# Altium integrated library Weidmueller_OMNIMATE_Signal.IntLib: 2550 symbols (part 16 of 45) (continued)
## 1630270000_Single (continued)
OMNIMATE Signal - series BL/SL 5.00; PartNumber: 1630270000; Manufacturer: Weidmueller; Short_text_for_material: SL 5.00/04/135 3.2SN OR BX; Side_termination_characteristic: open side; Mounting_onto_the_PCB: Solder connection; Pitch_mm: 5 mm; Pitch_inch: 0.197 inch; No_of_poles: 4; Outgoing_elbow: 135°; Solder_pin_length_mm: 3.2 mm; Contact_material: CuSn; Contact_surface: tinned; Insulating_material: PBT; UL_94_flammability_rating: V-0; Rated_voltage_for_surge_voltage_class_pollution_degree_II_2: 400 V; Rated_current_min_no_of_poles_TU_20_deg_C: 32 A; Rated_voltage_use_group_B_UL_1059: 300 V; Rated_current_use_group_B_UL_1059: 15 A; PackageReference: SL_5_00_135_04; Colour: Orange; Packaging: Box; Qty: 100 PCS; Revision: V1; ComponentLink1Description: Manufacturer URL; ComponentLink1URL: http://www.weidmueller.com/; ComponentLink2Description: URL Link1; ComponentLink2URL: http://catalog.weidmueller.com/catalog/Start.do?localeId=en&ObjectID=1630270000
footprint SL_5_00_135_04 (OMNIMATE Signal - Serie BL/SL 5.00  SL 5.00/04/135 3.2)
part A pins: A1
part B pins: A2
part C pins: A3
part D pins: A4

## 1630310000
designator J?
OMNIMATE Signal - series BL/SL 5.00; PartNumber: 1630310000; Manufacturer: Weidmueller; Short_text_for_material: SL 5.00/08/135 3.2SN OR BX; Side_termination_characteristic: open side; Mounting_onto_the_PCB: Solder connection; Pitch_mm: 5 mm; Pitch_inch: 0.197 inch; No_of_poles: 8; Outgoing_elbow: 135°; Solder_pin_length_mm: 3.2 mm; Contact_material: CuSn; Contact_surface: tinned; Insulating_material: PBT; UL_94_flammability_rating: V-0; Rated_voltage_for_surge_voltage_class_pollution_degree_II_2: 400 V; Rated_current_min_no_of_poles_TU_20_deg_C: 32 A; Rated_voltage_use_group_B_UL_1059: 300 V; Rated_current_use_group_B_UL_1059: 15 A; PackageReference: SL_5_00_135_08; Colour: Orange; Packaging: Box; Qty: 50 PCS; Revision: V1; ComponentLink1Description: Manufacturer URL; ComponentLink1URL: http://www.weidmueller.com/; ComponentLink2Description: URL Link1; ComponentLink2URL: http://catalog.weidmueller.com/catalog/Start.do?localeId=en&ObjectID=1630310000
footprint SL_5_00_135_08 (OMNIMATE Signal - Serie BL/SL 5.00  SL 5.00/08/135 3.2)
pins: A1, A2, A3, A4, A5, A6, A7, A8

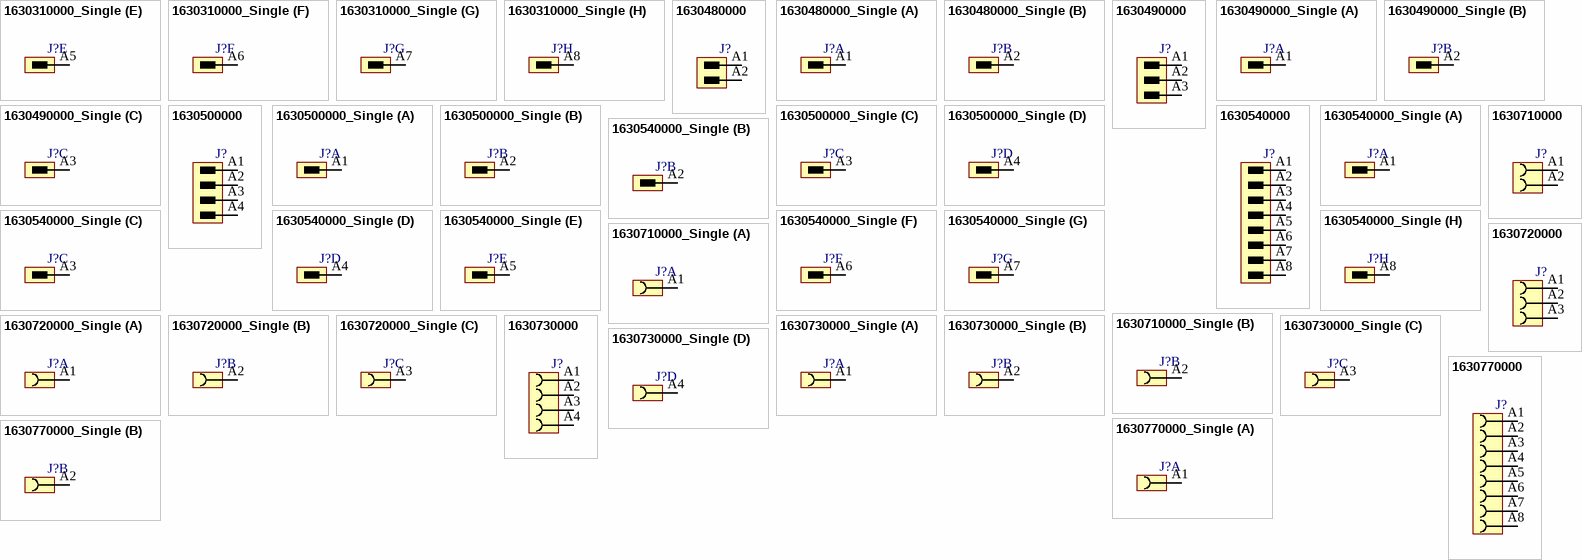
[diagram p89: symbols 1630310000_Single to 1630770000_Single]

## 1630310000_Single
designator J?
OMNIMATE Signal - series BL/SL 5.00; PartNumber: 1630310000; Manufacturer: Weidmueller; Short_text_for_material: SL 5.00/08/135 3.2SN OR BX; Side_termination_characteristic: open side; Mounting_onto_the_PCB: Solder connection; Pitch_mm: 5 mm; Pitch_inch: 0.197 inch; No_of_poles: 8; Outgoing_elbow: 135°; Solder_pin_length_mm: 3.2 mm; Contact_material: CuSn; Contact_surface: tinned; Insulating_material: PBT; UL_94_flammability_rating: V-0; Rated_voltage_for_surge_voltage_class_pollution_degree_II_2: 400 V; Rated_current_min_no_of_poles_TU_20_deg_C: 32 A; Rated_voltage_use_group_B_UL_1059: 300 V; Rated_current_use_group_B_UL_1059: 15 A; PackageReference: SL_5_00_135_08; Colour: Orange; Packaging: Box; Qty: 50 PCS; Revision: V1; ComponentLink1Description: Manufacturer URL; ComponentLink1URL: http://www.weidmueller.com/; ComponentLink2Description: URL Link1; ComponentLink2URL: http://catalog.weidmueller.com/catalog/Start.do?localeId=en&ObjectID=1630310000
footprint SL_5_00_135_08 (OMNIMATE Signal - Serie BL/SL 5.00  SL 5.00/08/135 3.2)
part A pins: A1
part B pins: A2
part C pins: A3
part D pins: A4
part E pins: A5
part F pins: A6
part G pins: A7
part H pins: A8

## 1630480000
designator J?
OMNIMATE Signal - series BL/SL 5.00; PartNumber: 1630480000; Manufacturer: Weidmueller; Short_text_for_material: SL 5.00/02/135B 3.2SN OR BX; Side_termination_characteristic: Dovetails for fixing blocks; Mounting_onto_the_PCB: Solder connection; Pitch_mm: 5 mm; Pitch_inch: 0.197 inch; No_of_poles: 2; Outgoing_elbow: 135°; Solder_pin_length_mm: 3.2 mm; Contact_material: CuSn; Contact_surface: tinned; Insulating_material: PBT; UL_94_flammability_rating: V-0; Rated_voltage_for_surge_voltage_class_pollution_degree_II_2: 400 V; Rated_current_min_no_of_poles_TU_20_deg_C: 32 A; Rated_voltage_use_group_B_UL_1059: 300 V; Rated_current_use_group_B_UL_1059: 15 A; PackageReference: SL_5_00_135B_02; Colour: Orange; Packaging: Box; Qty: 100 PCS; Revision: V1; ComponentLink1Description: Manufacturer URL; ComponentLink1URL: http://www.weidmueller.com/; ComponentLink2Description: URL Link1; ComponentLink2URL: http://catalog.weidmueller.com/catalog/Start.do?localeId=en&ObjectID=1630480000
footprint SL_5_00_135B_02 (OMNIMATE Signal - Serie BL/SL 5.00  SL 5.00/02/135B 3.2)
pins: A1, A2

## 1630480000_Single
designator J?
OMNIMATE Signal - series BL/SL 5.00; PartNumber: 1630480000; Manufacturer: Weidmueller; Short_text_for_material: SL 5.00/02/135B 3.2SN OR BX; Side_termination_characteristic: Dovetails for fixing blocks; Mounting_onto_the_PCB: Solder connection; Pitch_mm: 5 mm; Pitch_inch: 0.197 inch; No_of_poles: 2; Outgoing_elbow: 135°; Solder_pin_length_mm: 3.2 mm; Contact_material: CuSn; Contact_surface: tinned; Insulating_material: PBT; UL_94_flammability_rating: V-0; Rated_voltage_for_surge_voltage_class_pollution_degree_II_2: 400 V; Rated_current_min_no_of_poles_TU_20_deg_C: 32 A; Rated_voltage_use_group_B_UL_1059: 300 V; Rated_current_use_group_B_UL_1059: 15 A; PackageReference: SL_5_00_135B_02; Colour: Orange; Packaging: Box; Qty: 100 PCS; Revision: V1; ComponentLink1Description: Manufacturer URL; ComponentLink1URL: http://www.weidmueller.com/; ComponentLink2Description: URL Link1; ComponentLink2URL: http://catalog.weidmueller.com/catalog/Start.do?localeId=en&ObjectID=1630480000
footprint SL_5_00_135B_02 (OMNIMATE Signal - Serie BL/SL 5.00  SL 5.00/02/135B 3.2)
part A pins: A1
part B pins: A2

## 1630490000
designator J?
OMNIMATE Signal - series BL/SL 5.00; PartNumber: 1630490000; Manufacturer: Weidmueller; Short_text_for_material: SL 5.00/03/135B 3.2SN OR BX; Side_termination_characteristic: Dovetails for fixing blocks; Mounting_onto_the_PCB: Solder connection; Pitch_mm: 5 mm; Pitch_inch: 0.197 inch; No_of_poles: 3; Outgoing_elbow: 135°; Solder_pin_length_mm: 3.2 mm; Contact_material: CuSn; Contact_surface: tinned; Insulating_material: PBT; UL_94_flammability_rating: V-0; Rated_voltage_for_surge_voltage_class_pollution_degree_II_2: 400 V; Rated_current_min_no_of_poles_TU_20_deg_C: 32 A; Rated_voltage_use_group_B_UL_1059: 300 V; Rated_current_use_group_B_UL_1059: 15 A; PackageReference: SL_5_00_135B_03; Colour: Orange; Packaging: Box; Qty: 100 PCS; Revision: V1; ComponentLink1Description: Manufacturer URL; ComponentLink1URL: http://www.weidmueller.com/; ComponentLink2Description: URL Link1; ComponentLink2URL: http://catalog.weidmueller.com/catalog/Start.do?localeId=en&ObjectID=1630490000
footprint SL_5_00_135B_03 (OMNIMATE Signal - Serie BL/SL 5.00  SL 5.00/03/135B 3.2)
pins: A1, A2, A3

## 1630490000_Single
designator J?
OMNIMATE Signal - series BL/SL 5.00; PartNumber: 1630490000; Manufacturer: Weidmueller; Short_text_for_material: SL 5.00/03/135B 3.2SN OR BX; Side_termination_characteristic: Dovetails for fixing blocks; Mounting_onto_the_PCB: Solder connection; Pitch_mm: 5 mm; Pitch_inch: 0.197 inch; No_of_poles: 3; Outgoing_elbow: 135°; Solder_pin_length_mm: 3.2 mm; Contact_material: CuSn; Contact_surface: tinned; Insulating_material: PBT; UL_94_flammability_rating: V-0; Rated_voltage_for_surge_voltage_class_pollution_degree_II_2: 400 V; Rated_current_min_no_of_poles_TU_20_deg_C: 32 A; Rated_voltage_use_group_B_UL_1059: 300 V; Rated_current_use_group_B_UL_1059: 15 A; PackageReference: SL_5_00_135B_03; Colour: Orange; Packaging: Box; Qty: 100 PCS; Revision: V1; ComponentLink1Description: Manufacturer URL; ComponentLink1URL: http://www.weidmueller.com/; ComponentLink2Description: URL Link1; ComponentLink2URL: http://catalog.weidmueller.com/catalog/Start.do?localeId=en&ObjectID=1630490000
footprint SL_5_00_135B_03 (OMNIMATE Signal - Serie BL/SL 5.00  SL 5.00/03/135B 3.2)
part A pins: A1
part B pins: A2
part C pins: A3

## 1630500000
designator J?
OMNIMATE Signal - series BL/SL 5.00; PartNumber: 1630500000; Manufacturer: Weidmueller; Short_text_for_material: SL 5.00/04/135B 3.2SN OR BX; Side_termination_characteristic: Dovetails for fixing blocks; Mounting_onto_the_PCB: Solder connection; Pitch_mm: 5 mm; Pitch_inch: 0.197 inch; No_of_poles: 4; Outgoing_elbow: 135°; Solder_pin_length_mm: 3.2 mm; Contact_material: CuSn; Contact_surface: tinned; Insulating_material: PBT; UL_94_flammability_rating: V-0; Rated_voltage_for_surge_voltage_class_pollution_degree_II_2: 400 V; Rated_current_min_no_of_poles_TU_20_deg_C: 32 A; Rated_voltage_use_group_B_UL_1059: 300 V; Rated_current_use_group_B_UL_1059: 15 A; PackageReference: SL_5_00_135B_04; Colour: Orange; Packaging: Box; Qty: 100 PCS; Revision: V1; ComponentLink1Description: Manufacturer URL; ComponentLink1URL: http://www.weidmueller.com/; ComponentLink2Description: URL Link1; ComponentLink2URL: http://catalog.weidmueller.com/catalog/Start.do?localeId=en&ObjectID=1630500000
footprint SL_5_00_135B_04 (OMNIMATE Signal - Serie BL/SL 5.00  SL 5.00/04/135B 3.2)
pins: A1, A2, A3, A4

## 1630500000_Single
designator J?
OMNIMATE Signal - series BL/SL 5.00; PartNumber: 1630500000; Manufacturer: Weidmueller; Short_text_for_material: SL 5.00/04/135B 3.2SN OR BX; Side_termination_characteristic: Dovetails for fixing blocks; Mounting_onto_the_PCB: Solder connection; Pitch_mm: 5 mm; Pitch_inch: 0.197 inch; No_of_poles: 4; Outgoing_elbow: 135°; Solder_pin_length_mm: 3.2 mm; Contact_material: CuSn; Contact_surface: tinned; Insulating_material: PBT; UL_94_flammability_rating: V-0; Rated_voltage_for_surge_voltage_class_pollution_degree_II_2: 400 V; Rated_current_min_no_of_poles_TU_20_deg_C: 32 A; Rated_voltage_use_group_B_UL_1059: 300 V; Rated_current_use_group_B_UL_1059: 15 A; PackageReference: SL_5_00_135B_04; Colour: Orange; Packaging: Box; Qty: 100 PCS; Revision: V1; ComponentLink1Description: Manufacturer URL; ComponentLink1URL: http://www.weidmueller.com/; ComponentLink2Description: URL Link1; ComponentLink2URL: http://catalog.weidmueller.com/catalog/Start.do?localeId=en&ObjectID=1630500000
footprint SL_5_00_135B_04 (OMNIMATE Signal - Serie BL/SL 5.00  SL 5.00/04/135B 3.2)
part A pins: A1
part B pins: A2
part C pins: A3
part D pins: A4

## 1630540000
designator J?
OMNIMATE Signal - series BL/SL 5.00; PartNumber: 1630540000; Manufacturer: Weidmueller; Short_text_for_material: SL 5.00/08/135B 3.2SN OR BX; Side_termination_characteristic: Dovetails for fixing blocks; Mounting_onto_the_PCB: Solder connection; Pitch_mm: 5 mm; Pitch_inch: 0.197 inch; No_of_poles: 8; Outgoing_elbow: 135°; Solder_pin_length_mm: 3.2 mm; Contact_material: CuSn; Contact_surface: tinned; Insulating_material: PBT; UL_94_flammability_rating: V-0; Rated_voltage_for_surge_voltage_class_pollution_degree_II_2: 400 V; Rated_current_min_no_of_poles_TU_20_deg_C: 32 A; Rated_voltage_use_group_B_UL_1059: 300 V; Rated_current_use_group_B_UL_1059: 15 A; PackageReference: SL_5_00_135B_08; Colour: Orange; Packaging: Box; Qty: 50 PCS; Revision: V1; ComponentLink1Description: Manufacturer URL; ComponentLink1URL: http://www.weidmueller.com/; ComponentLink2Description: URL Link1; ComponentLink2URL: http://catalog.weidmueller.com/catalog/Start.do?localeId=en&ObjectID=1630540000
footprint SL_5_00_135B_08 (OMNIMATE Signal - Serie BL/SL 5.00  SL 5.00/08/135B 3.2)
pins: A1, A2, A3, A4, A5, A6, A7, A8

## 1630540000_Single
designator J?
OMNIMATE Signal - series BL/SL 5.00; PartNumber: 1630540000; Manufacturer: Weidmueller; Short_text_for_material: SL 5.00/08/135B 3.2SN OR BX; Side_termination_characteristic: Dovetails for fixing blocks; Mounting_onto_the_PCB: Solder connection; Pitch_mm: 5 mm; Pitch_inch: 0.197 inch; No_of_poles: 8; Outgoing_elbow: 135°; Solder_pin_length_mm: 3.2 mm; Contact_material: CuSn; Contact_surface: tinned; Insulating_material: PBT; UL_94_flammability_rating: V-0; Rated_voltage_for_surge_voltage_class_pollution_degree_II_2: 400 V; Rated_current_min_no_of_poles_TU_20_deg_C: 32 A; Rated_voltage_use_group_B_UL_1059: 300 V; Rated_current_use_group_B_UL_1059: 15 A; PackageReference: SL_5_00_135B_08; Colour: Orange; Packaging: Box; Qty: 50 PCS; Revision: V1; ComponentLink1Description: Manufacturer URL; ComponentLink1URL: http://www.weidmueller.com/; ComponentLink2Description: URL Link1; ComponentLink2URL: http://catalog.weidmueller.com/catalog/Start.do?localeId=en&ObjectID=1630540000
footprint SL_5_00_135B_08 (OMNIMATE Signal - Serie BL/SL 5.00  SL 5.00/08/135B 3.2)
part A pins: A1
part B pins: A2
part C pins: A3
part D pins: A4
part E pins: A5
part F pins: A6
part G pins: A7
part H pins: A8

## 1630710000
designator J?
OMNIMATE Signal - series BL/SL 5.08; PartNumber: 1630710000; Manufacturer: Weidmueller; Short_text_for_material: BLL 5.08/02/180 3.2 SN OR BX; Side_termination_characteristic: closed side; Mounting_onto_the_PCB: Solder connection; Pitch_mm: 5.08 mm; Pitch_inch: 0.2 inch; No_of_poles: 2; Outgoing_elbow: 180°; Solder_pin_length_mm: 3.2 mm; Contact_material: Cu-Leg; Contact_surface: tinned; Insulating_material: PBT GF; UL_94_flammability_rating: V-0; Rated_voltage_for_surge_voltage_class_pollution_degree_II_2: 400 V; Rated_current_min_no_of_poles_TU_20_deg_C: 32 A; Rated_voltage_use_group_B_UL_1059: 300 V; Rated_current_use_group_B_UL_1059: 15 A; PackageReference: BLL_5_08_180_02; Colour: Orange; Packaging: Box; Qty: 180 PCS; Revision: V1; ComponentLink1Description: Manufacturer URL; ComponentLink1URL: http://www.weidmueller.com/; ComponentLink2Description: URL Link1; ComponentLink2URL: http://catalog.weidmueller.com/catalog/Start.do?localeId=en&ObjectID=1630710000
footprint BLL_5_08_180_02 (OMNIMATE Signal - Serie BL/SL 5.08  BLL 5.08/02/180 3.2)
pins: A1, A2

## 1630710000_Single
designator J?
OMNIMATE Signal - series BL/SL 5.08; PartNumber: 1630710000; Manufacturer: Weidmueller; Short_text_for_material: BLL 5.08/02/180 3.2 SN OR BX; Side_termination_characteristic: closed side; Mounting_onto_the_PCB: Solder connection; Pitch_mm: 5.08 mm; Pitch_inch: 0.2 inch; No_of_poles: 2; Outgoing_elbow: 180°; Solder_pin_length_mm: 3.2 mm; Contact_material: Cu-Leg; Contact_surface: tinned; Insulating_material: PBT GF; UL_94_flammability_rating: V-0; Rated_voltage_for_surge_voltage_class_pollution_degree_II_2: 400 V; Rated_current_min_no_of_poles_TU_20_deg_C: 32 A; Rated_voltage_use_group_B_UL_1059: 300 V; Rated_current_use_group_B_UL_1059: 15 A; PackageReference: BLL_5_08_180_02; Colour: Orange; Packaging: Box; Qty: 180 PCS; Revision: V1; ComponentLink1Description: Manufacturer URL; ComponentLink1URL: http://www.weidmueller.com/; ComponentLink2Description: URL Link1; ComponentLink2URL: http://catalog.weidmueller.com/catalog/Start.do?localeId=en&ObjectID=1630710000
footprint BLL_5_08_180_02 (OMNIMATE Signal - Serie BL/SL 5.08  BLL 5.08/02/180 3.2)
part A pins: A1
part B pins: A2

## 1630720000
designator J?
OMNIMATE Signal - series BL/SL 5.08; PartNumber: 1630720000; Manufacturer: Weidmueller; Short_text_for_material: BLL 5.08/03/180 3.2 SN OR BX; Side_termination_characteristic: closed side; Mounting_onto_the_PCB: Solder connection; Pitch_mm: 5.08 mm; Pitch_inch: 0.2 inch; No_of_poles: 3; Outgoing_elbow: 180°; Solder_pin_length_mm: 3.2 mm; Contact_material: Cu-Leg; Contact_surface: tinned; Insulating_material: PBT GF; UL_94_flammability_rating: V-0; Rated_voltage_for_surge_voltage_class_pollution_degree_II_2: 400 V; Rated_current_min_no_of_poles_TU_20_deg_C: 32 A; Rated_voltage_use_group_B_UL_1059: 300 V; Rated_current_use_group_B_UL_1059: 15 A; PackageReference: BLL_5_08_180_03; Colour: Orange; Packaging: Box; Qty: 120 PCS; Revision: V1; ComponentLink1Description: Manufacturer URL; ComponentLink1URL: http://www.weidmueller.com/; ComponentLink2Description: URL Link1; ComponentLink2URL: http://catalog.weidmueller.com/catalog/Start.do?localeId=en&ObjectID=1630720000
footprint BLL_5_08_180_03 (OMNIMATE Signal - Serie BL/SL 5.08  BLL 5.08/03/180 3.2)
pins: A1, A2, A3

## 1630720000_Single
designator J?
OMNIMATE Signal - series BL/SL 5.08; PartNumber: 1630720000; Manufacturer: Weidmueller; Short_text_for_material: BLL 5.08/03/180 3.2 SN OR BX; Side_termination_characteristic: closed side; Mounting_onto_the_PCB: Solder connection; Pitch_mm: 5.08 mm; Pitch_inch: 0.2 inch; No_of_poles: 3; Outgoing_elbow: 180°; Solder_pin_length_mm: 3.2 mm; Contact_material: Cu-Leg; Contact_surface: tinned; Insulating_material: PBT GF; UL_94_flammability_rating: V-0; Rated_voltage_for_surge_voltage_class_pollution_degree_II_2: 400 V; Rated_current_min_no_of_poles_TU_20_deg_C: 32 A; Rated_voltage_use_group_B_UL_1059: 300 V; Rated_current_use_group_B_UL_1059: 15 A; PackageReference: BLL_5_08_180_03; Colour: Orange; Packaging: Box; Qty: 120 PCS; Revision: V1; ComponentLink1Description: Manufacturer URL; ComponentLink1URL: http://www.weidmueller.com/; ComponentLink2Description: URL Link1; ComponentLink2URL: http://catalog.weidmueller.com/catalog/Start.do?localeId=en&ObjectID=1630720000
footprint BLL_5_08_180_03 (OMNIMATE Signal - Serie BL/SL 5.08  BLL 5.08/03/180 3.2)
part A pins: A1
part B pins: A2
part C pins: A3

## 1630730000
designator J?
OMNIMATE Signal - series BL/SL 5.08; PartNumber: 1630730000; Manufacturer: Weidmueller; Short_text_for_material: BLL 5.08/04/180 3.2 SN OR BX; Side_termination_characteristic: closed side; Mounting_onto_the_PCB: Solder connection; Pitch_mm: 5.08 mm; Pitch_inch: 0.2 inch; No_of_poles: 4; Outgoing_elbow: 180°; Solder_pin_length_mm: 3.2 mm; Contact_material: Cu-Leg; Contact_surface: tinned; Insulating_material: PBT GF; UL_94_flammability_rating: V-0; Rated_voltage_for_surge_voltage_class_pollution_degree_II_2: 400 V; Rated_current_min_no_of_poles_TU_20_deg_C: 32 A; Rated_voltage_use_group_B_UL_1059: 300 V; Rated_current_use_group_B_UL_1059: 15 A; PackageReference: BLL_5_08_180_04; Colour: Orange; Packaging: Box; Qty: 90 PCS; Revision: V1; ComponentLink1Description: Manufacturer URL; ComponentLink1URL: http://www.weidmueller.com/; ComponentLink2Description: URL Link1; ComponentLink2URL: http://catalog.weidmueller.com/catalog/Start.do?localeId=en&ObjectID=1630730000
footprint BLL_5_08_180_04 (OMNIMATE Signal - Serie BL/SL 5.08  BLL 5.08/04/180 3.2)
pins: A1, A2, A3, A4

## 1630730000_Single
designator J?
OMNIMATE Signal - series BL/SL 5.08; PartNumber: 1630730000; Manufacturer: Weidmueller; Short_text_for_material: BLL 5.08/04/180 3.2 SN OR BX; Side_termination_characteristic: closed side; Mounting_onto_the_PCB: Solder connection; Pitch_mm: 5.08 mm; Pitch_inch: 0.2 inch; No_of_poles: 4; Outgoing_elbow: 180°; Solder_pin_length_mm: 3.2 mm; Contact_material: Cu-Leg; Contact_surface: tinned; Insulating_material: PBT GF; UL_94_flammability_rating: V-0; Rated_voltage_for_surge_voltage_class_pollution_degree_II_2: 400 V; Rated_current_min_no_of_poles_TU_20_deg_C: 32 A; Rated_voltage_use_group_B_UL_1059: 300 V; Rated_current_use_group_B_UL_1059: 15 A; PackageReference: BLL_5_08_180_04; Colour: Orange; Packaging: Box; Qty: 90 PCS; Revision: V1; ComponentLink1Description: Manufacturer URL; ComponentLink1URL: http://www.weidmueller.com/; ComponentLink2Description: URL Link1; ComponentLink2URL: http://catalog.weidmueller.com/catalog/Start.do?localeId=en&ObjectID=1630730000
footprint BLL_5_08_180_04 (OMNIMATE Signal - Serie BL/SL 5.08  BLL 5.08/04/180 3.2)
part A pins: A1
part B pins: A2
part C pins: A3
part D pins: A4

## 1630770000
designator J?
OMNIMATE Signal - series BL/SL 5.08; PartNumber: 1630770000; Manufacturer: Weidmueller; Short_text_for_material: BLL 5.08/08/180 3.2 SN OR BX; Side_termination_characteristic: closed side; Mounting_onto_the_PCB: Solder connection; Pitch_mm: 5.08 mm; Pitch_inch: 0.2 inch; No_of_poles: 8; Outgoing_elbow: 180°; Solder_pin_length_mm: 3.2 mm; Contact_material: Cu-Leg; Contact_surface: tinned; Insulating_material: PBT GF; UL_94_flammability_rating: V-0; Rated_voltage_for_surge_voltage_class_pollution_degree_II_2: 400 V; Rated_current_min_no_of_poles_TU_20_deg_C: 32 A; Rated_voltage_use_group_B_UL_1059: 300 V; Rated_current_use_group_B_UL_1059: 15 A; PackageReference: BLL_5_08_180_08; Colour: Orange; Packaging: Box; Qty: 42 PCS; Revision: V1; ComponentLink1Description: Manufacturer URL; ComponentLink1URL: http://www.weidmueller.com/; ComponentLink2Description: URL Link1; ComponentLink2URL: http://catalog.weidmueller.com/catalog/Start.do?localeId=en&ObjectID=1630770000
footprint BLL_5_08_180_08 (OMNIMATE Signal - Serie BL/SL 5.08  BLL 5.08/08/180 3.2)
pins: A1, A2, A3, A4, A5, A6, A7, A8

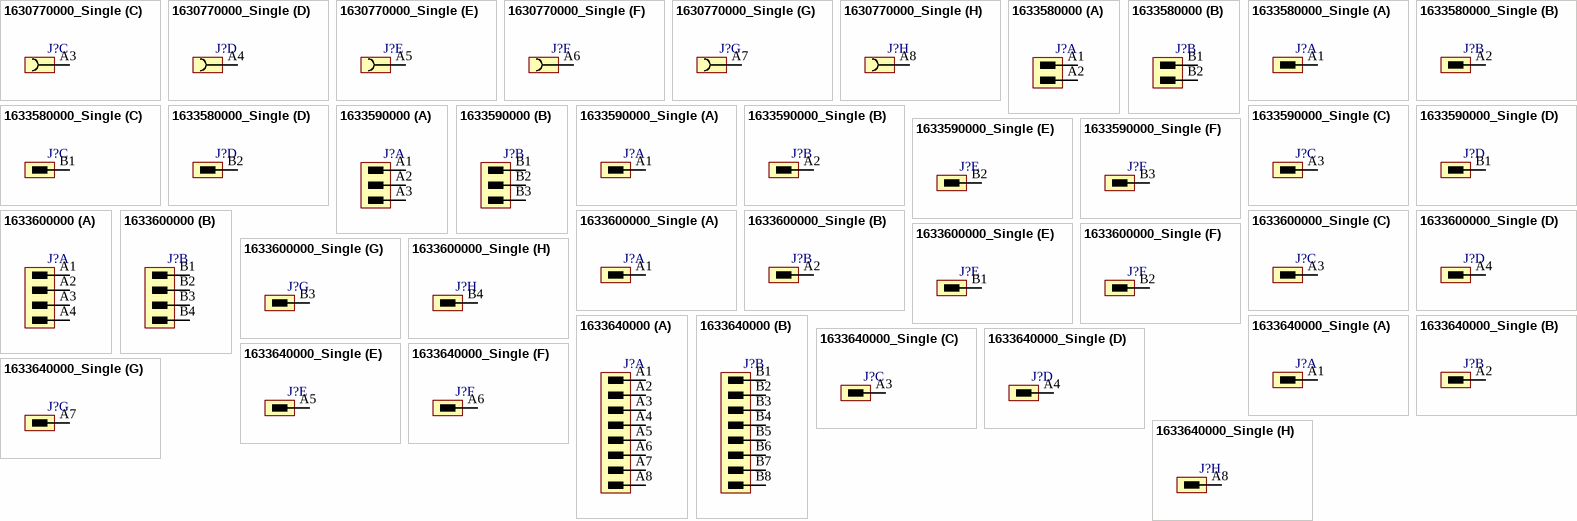
[diagram p90: symbols 1630770000_Single to 1633640000_Single]

## 1630770000_Single
designator J?
OMNIMATE Signal - series BL/SL 5.08; PartNumber: 1630770000; Manufacturer: Weidmueller; Short_text_for_material: BLL 5.08/08/180 3.2 SN OR BX; Side_termination_characteristic: closed side; Mounting_onto_the_PCB: Solder connection; Pitch_mm: 5.08 mm; Pitch_inch: 0.2 inch; No_of_poles: 8; Outgoing_elbow: 180°; Solder_pin_length_mm: 3.2 mm; Contact_material: Cu-Leg; Contact_surface: tinned; Insulating_material: PBT GF; UL_94_flammability_rating: V-0; Rated_voltage_for_surge_voltage_class_pollution_degree_II_2: 400 V; Rated_current_min_no_of_poles_TU_20_deg_C: 32 A; Rated_voltage_use_group_B_UL_1059: 300 V; Rated_current_use_group_B_UL_1059: 15 A; PackageReference: BLL_5_08_180_08; Colour: Orange; Packaging: Box; Qty: 42 PCS; Revision: V1; ComponentLink1Description: Manufacturer URL; ComponentLink1URL: http://www.weidmueller.com/; ComponentLink2Description: URL Link1; ComponentLink2URL: http://catalog.weidmueller.com/catalog/Start.do?localeId=en&ObjectID=1630770000
footprint BLL_5_08_180_08 (OMNIMATE Signal - Serie BL/SL 5.08  BLL 5.08/08/180 3.2)
part A pins: A1
part B pins: A2
part C pins: A3
part D pins: A4
part E pins: A5
part F pins: A6
part G pins: A7
part H pins: A8

## 1633580000
designator J?
OMNIMATE Signal - series BL/SL 3.50; PartNumber: 1633580000; Manufacturer: Weidmueller; Short_text_for_material: SLD 3.50/04/90G 3.2SN OR BX; Side_termination_characteristic: closed side; Mounting_onto_the_PCB: Solder connection; Pitch_mm: 3.5 mm; Pitch_inch: 0.138 inch; No_of_poles: 4; Outgoing_elbow: 90°; Solder_pin_length_mm: 3.2 mm; Contact_material: CuSn; Contact_surface: tinned; Insulating_material: PBT; UL_94_flammability_rating: V-0; Rated_voltage_for_surge_voltage_class_pollution_degree_II_2: 200 V; Rated_current_min_no_of_poles_TU_20_deg_C: 32 A; Rated_voltage_use_group_B_UL_1059: 300 V; Rated_current_use_group_B_UL_1059: 8 A; PackageReference: SLD_3_50_90G_04; Colour: Orange; Packaging: Box; Qty: 50 PCS; Revision: V1; ComponentLink1Description: Manufacturer URL; ComponentLink1URL: http://www.weidmueller.com/; ComponentLink2Description: URL Link1; ComponentLink2URL: http://catalog.weidmueller.com/catalog/Start.do?localeId=en&ObjectID=1633580000
footprint SLD_3_50_90G_04 (OMNIMATE Signal - Serie BL/SL 3.50  SLD 3.50/04/90G 3.2)
part A pins: A1, A2
part B pins: B1, B2

## 1633580000_Single
designator J?
OMNIMATE Signal - series BL/SL 3.50; PartNumber: 1633580000; Manufacturer: Weidmueller; Short_text_for_material: SLD 3.50/04/90G 3.2SN OR BX; Side_termination_characteristic: closed side; Mounting_onto_the_PCB: Solder connection; Pitch_mm: 3.5 mm; Pitch_inch: 0.138 inch; No_of_poles: 4; Outgoing_elbow: 90°; Solder_pin_length_mm: 3.2 mm; Contact_material: CuSn; Contact_surface: tinned; Insulating_material: PBT; UL_94_flammability_rating: V-0; Rated_voltage_for_surge_voltage_class_pollution_degree_II_2: 200 V; Rated_current_min_no_of_poles_TU_20_deg_C: 32 A; Rated_voltage_use_group_B_UL_1059: 300 V; Rated_current_use_group_B_UL_1059: 8 A; PackageReference: SLD_3_50_90G_04; Colour: Orange; Packaging: Box; Qty: 50 PCS; Revision: V1; ComponentLink1Description: Manufacturer URL; ComponentLink1URL: http://www.weidmueller.com/; ComponentLink2Description: URL Link1; ComponentLink2URL: http://catalog.weidmueller.com/catalog/Start.do?localeId=en&ObjectID=1633580000
footprint SLD_3_50_90G_04 (OMNIMATE Signal - Serie BL/SL 3.50  SLD 3.50/04/90G 3.2)
part A pins: A1
part B pins: A2
part C pins: B1
part D pins: B2

## 1633590000
designator J?
OMNIMATE Signal - series BL/SL 3.50; PartNumber: 1633590000; Manufacturer: Weidmueller; Short_text_for_material: SLD 3.50/06/90G 3.2SN OR BX; Side_termination_characteristic: closed side; Mounting_onto_the_PCB: Solder connection; Pitch_mm: 3.5 mm; Pitch_inch: 0.138 inch; No_of_poles: 6; Outgoing_elbow: 90°; Solder_pin_length_mm: 3.2 mm; Contact_material: CuSn; Contact_surface: tinned; Insulating_material: PBT; UL_94_flammability_rating: V-0; Rated_voltage_for_surge_voltage_class_pollution_degree_II_2: 200 V; Rated_current_min_no_of_poles_TU_20_deg_C: 32 A; Rated_voltage_use_group_B_UL_1059: 300 V; Rated_current_use_group_B_UL_1059: 8 A; PackageReference: SLD_3_50_90G_06; Colour: Orange; Packaging: Box; Qty: 50 PCS; Revision: V1; ComponentLink1Description: Manufacturer URL; ComponentLink1URL: http://www.weidmueller.com/; ComponentLink2Description: URL Link1; ComponentLink2URL: http://catalog.weidmueller.com/catalog/Start.do?localeId=en&ObjectID=1633590000
footprint SLD_3_50_90G_06 (OMNIMATE Signal - Serie BL/SL 3.50  SLD 3.50/06/90G 3.2)
part A pins: A1, A2, A3
part B pins: B1, B2, B3

## 1633590000_Single
designator J?
OMNIMATE Signal - series BL/SL 3.50; PartNumber: 1633590000; Manufacturer: Weidmueller; Short_text_for_material: SLD 3.50/06/90G 3.2SN OR BX; Side_termination_characteristic: closed side; Mounting_onto_the_PCB: Solder connection; Pitch_mm: 3.5 mm; Pitch_inch: 0.138 inch; No_of_poles: 6; Outgoing_elbow: 90°; Solder_pin_length_mm: 3.2 mm; Contact_material: CuSn; Contact_surface: tinned; Insulating_material: PBT; UL_94_flammability_rating: V-0; Rated_voltage_for_surge_voltage_class_pollution_degree_II_2: 200 V; Rated_current_min_no_of_poles_TU_20_deg_C: 32 A; Rated_voltage_use_group_B_UL_1059: 300 V; Rated_current_use_group_B_UL_1059: 8 A; PackageReference: SLD_3_50_90G_06; Colour: Orange; Packaging: Box; Qty: 50 PCS; Revision: V1; ComponentLink1Description: Manufacturer URL; ComponentLink1URL: http://www.weidmueller.com/; ComponentLink2Description: URL Link1; ComponentLink2URL: http://catalog.weidmueller.com/catalog/Start.do?localeId=en&ObjectID=1633590000
footprint SLD_3_50_90G_06 (OMNIMATE Signal - Serie BL/SL 3.50  SLD 3.50/06/90G 3.2)
part A pins: A1
part B pins: A2
part C pins: A3
part D pins: B1
part E pins: B2
part F pins: B3

## 1633600000
designator J?
OMNIMATE Signal - series BL/SL 3.50; PartNumber: 1633600000; Manufacturer: Weidmueller; Short_text_for_material: SLD 3.50/08/90G 3.2SN OR BX; Side_termination_characteristic: closed side; Mounting_onto_the_PCB: Solder connection; Pitch_mm: 3.5 mm; Pitch_inch: 0.138 inch; No_of_poles: 8; Outgoing_elbow: 90°; Solder_pin_length_mm: 3.2 mm; Contact_material: CuSn; Contact_surface: tinned; Insulating_material: PBT; UL_94_flammability_rating: V-0; Rated_voltage_for_surge_voltage_class_pollution_degree_II_2: 200 V; Rated_current_min_no_of_poles_TU_20_deg_C: 32 A; Rated_voltage_use_group_B_UL_1059: 300 V; Rated_current_use_group_B_UL_1059: 8 A; PackageReference: SLD_3_50_90G_08; Colour: Orange; Packaging: Box; Qty: 50 PCS; Revision: V1; ComponentLink1Description: Manufacturer URL; ComponentLink1URL: http://www.weidmueller.com/; ComponentLink2Description: URL Link1; ComponentLink2URL: http://catalog.weidmueller.com/catalog/Start.do?localeId=en&ObjectID=1633600000
footprint SLD_3_50_90G_08 (OMNIMATE Signal - Serie BL/SL 3.50  SLD 3.50/08/90G 3.2)
part A pins: A1, A2, A3, A4
part B pins: B1, B2, B3, B4

## 1633600000_Single
designator J?
OMNIMATE Signal - series BL/SL 3.50; PartNumber: 1633600000; Manufacturer: Weidmueller; Short_text_for_material: SLD 3.50/08/90G 3.2SN OR BX; Side_termination_characteristic: closed side; Mounting_onto_the_PCB: Solder connection; Pitch_mm: 3.5 mm; Pitch_inch: 0.138 inch; No_of_poles: 8; Outgoing_elbow: 90°; Solder_pin_length_mm: 3.2 mm; Contact_material: CuSn; Contact_surface: tinned; Insulating_material: PBT; UL_94_flammability_rating: V-0; Rated_voltage_for_surge_voltage_class_pollution_degree_II_2: 200 V; Rated_current_min_no_of_poles_TU_20_deg_C: 32 A; Rated_voltage_use_group_B_UL_1059: 300 V; Rated_current_use_group_B_UL_1059: 8 A; PackageReference: SLD_3_50_90G_08; Colour: Orange; Packaging: Box; Qty: 50 PCS; Revision: V1; ComponentLink1Description: Manufacturer URL; ComponentLink1URL: http://www.weidmueller.com/; ComponentLink2Description: URL Link1; ComponentLink2URL: http://catalog.weidmueller.com/catalog/Start.do?localeId=en&ObjectID=1633600000
footprint SLD_3_50_90G_08 (OMNIMATE Signal - Serie BL/SL 3.50  SLD 3.50/08/90G 3.2)
part A pins: A1
part B pins: A2
part C pins: A3
part D pins: A4
part E pins: B1
part F pins: B2
part G pins: B3
part H pins: B4

## 1633640000
designator J?
OMNIMATE Signal - series BL/SL 3.50; PartNumber: 1633640000; Manufacturer: Weidmueller; Short_text_for_material: SLD 3.50/16/90G 3.2SN OR BX; Side_termination_characteristic: closed side; Mounting_onto_the_PCB: Solder connection; Pitch_mm: 3.5 mm; Pitch_inch: 0.138 inch; No_of_poles: 16; Outgoing_elbow: 90°; Solder_pin_length_mm: 3.2 mm; Contact_material: CuSn; Contact_surface: tinned; Insulating_material: PBT; UL_94_flammability_rating: V-0; Rated_voltage_for_surge_voltage_class_pollution_degree_II_2: 200 V; Rated_current_min_no_of_poles_TU_20_deg_C: 32 A; Rated_voltage_use_group_B_UL_1059: 300 V; Rated_current_use_group_B_UL_1059: 8 A; PackageReference: SLD_3_50_90G_16; Colour: Orange; Packaging: Box; Qty: 20 PCS; Revision: V1; ComponentLink1Description: Manufacturer URL; ComponentLink1URL: http://www.weidmueller.com/; ComponentLink2Description: URL Link1; ComponentLink2URL: http://catalog.weidmueller.com/catalog/Start.do?localeId=en&ObjectID=1633640000
footprint SLD_3_50_90G_16 (OMNIMATE Signal - Serie BL/SL 3.50  SLD 3.50/16/90G 3.2)
part A pins: A1, A2, A3, A4, A5, A6, A7, A8
part B pins: B1, B2, B3, B4, B5, B6, B7, B8

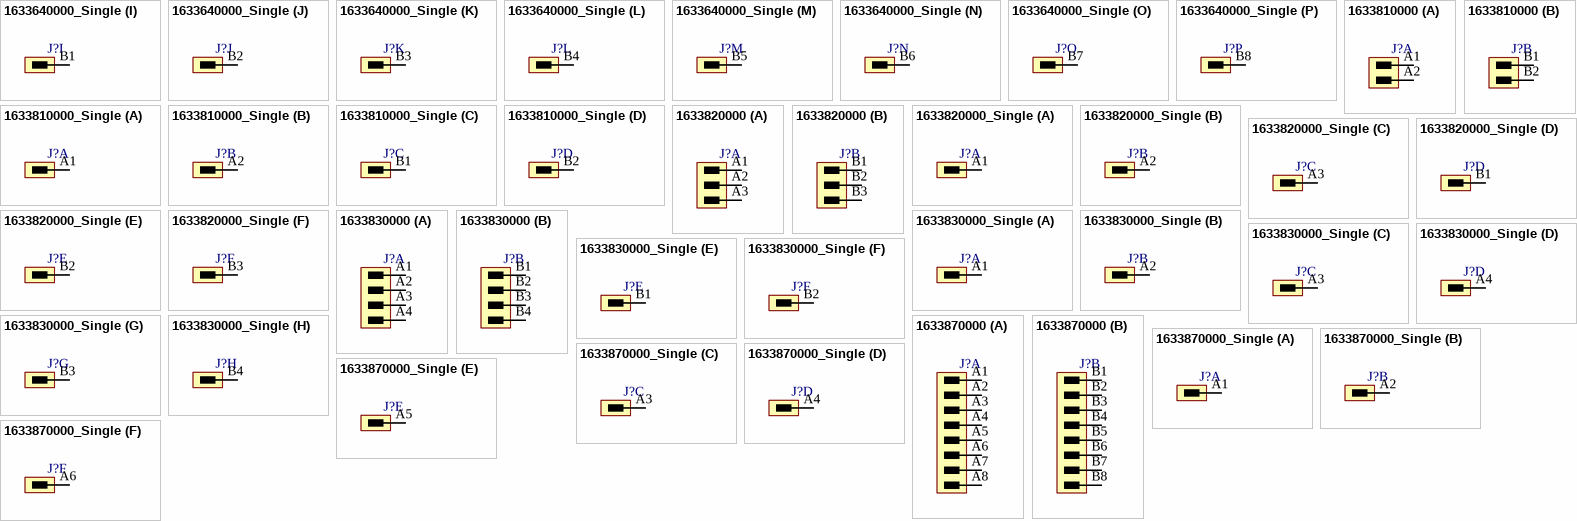
[diagram p91: symbols 1633640000_Single to 1633870000_Single]

## 1633640000_Single
designator J?
OMNIMATE Signal - series BL/SL 3.50; PartNumber: 1633640000; Manufacturer: Weidmueller; Short_text_for_material: SLD 3.50/16/90G 3.2SN OR BX; Side_termination_characteristic: closed side; Mounting_onto_the_PCB: Solder connection; Pitch_mm: 3.5 mm; Pitch_inch: 0.138 inch; No_of_poles: 16; Outgoing_elbow: 90°; Solder_pin_length_mm: 3.2 mm; Contact_material: CuSn; Contact_surface: tinned; Insulating_material: PBT; UL_94_flammability_rating: V-0; Rated_voltage_for_surge_voltage_class_pollution_degree_II_2: 200 V; Rated_current_min_no_of_poles_TU_20_deg_C: 32 A; Rated_voltage_use_group_B_UL_1059: 300 V; Rated_current_use_group_B_UL_1059: 8 A; PackageReference: SLD_3_50_90G_16; Colour: Orange; Packaging: Box; Qty: 20 PCS; Revision: V1; ComponentLink1Description: Manufacturer URL; ComponentLink1URL: http://www.weidmueller.com/; ComponentLink2Description: URL Link1; ComponentLink2URL: http://catalog.weidmueller.com/catalog/Start.do?localeId=en&ObjectID=1633640000
footprint SLD_3_50_90G_16 (OMNIMATE Signal - Serie BL/SL 3.50  SLD 3.50/16/90G 3.2)
part A pins: A1
part B pins: A2
part C pins: A3
part D pins: A4
part E pins: A5
part F pins: A6
part G pins: A7
part H pins: A8
part I pins: B1
part J pins: B2
part K pins: B3
part L pins: B4
part M pins: B5
part N pins: B6
part O pins: B7
part P pins: B8

## 1633810000
designator J?
OMNIMATE Signal - series BL/SL 3.50; PartNumber: 1633810000; Manufacturer: Weidmueller; Short_text_for_material: SLD 3.50/04/90F 3.2SN OR BX; Side_termination_characteristic: Flange; Mounting_onto_the_PCB: Solder connection; Pitch_mm: 3.5 mm; Pitch_inch: 0.138 inch; No_of_poles: 4; Outgoing_elbow: 90°; Solder_pin_length_mm: 3.2 mm; Contact_material: CuSn; Contact_surface: tinned; Insulating_material: PBT; UL_94_flammability_rating: V-0; Rated_voltage_for_surge_voltage_class_pollution_degree_II_2: 200 V; Rated_current_min_no_of_poles_TU_20_deg_C: 32 A; Rated_voltage_use_group_B_UL_1059: 300 V; Rated_current_use_group_B_UL_1059: 8 A; PackageReference: SLD_3_50_90F_04; Colour: Orange; Packaging: Box; Qty: 50 PCS; Revision: V1; ComponentLink1Description: Manufacturer URL; ComponentLink1URL: http://www.weidmueller.com/; ComponentLink2Description: URL Link1; ComponentLink2URL: http://catalog.weidmueller.com/catalog/Start.do?localeId=en&ObjectID=1633810000
footprint SLD_3_50_90F_04 (OMNIMATE Signal - Serie BL/SL 3.50  SLD 3.50/04/90F 3.2)
part A pins: A1, A2
part B pins: B1, B2

## 1633810000_Single
designator J?
OMNIMATE Signal - series BL/SL 3.50; PartNumber: 1633810000; Manufacturer: Weidmueller; Short_text_for_material: SLD 3.50/04/90F 3.2SN OR BX; Side_termination_characteristic: Flange; Mounting_onto_the_PCB: Solder connection; Pitch_mm: 3.5 mm; Pitch_inch: 0.138 inch; No_of_poles: 4; Outgoing_elbow: 90°; Solder_pin_length_mm: 3.2 mm; Contact_material: CuSn; Contact_surface: tinned; Insulating_material: PBT; UL_94_flammability_rating: V-0; Rated_voltage_for_surge_voltage_class_pollution_degree_II_2: 200 V; Rated_current_min_no_of_poles_TU_20_deg_C: 32 A; Rated_voltage_use_group_B_UL_1059: 300 V; Rated_current_use_group_B_UL_1059: 8 A; PackageReference: SLD_3_50_90F_04; Colour: Orange; Packaging: Box; Qty: 50 PCS; Revision: V1; ComponentLink1Description: Manufacturer URL; ComponentLink1URL: http://www.weidmueller.com/; ComponentLink2Description: URL Link1; ComponentLink2URL: http://catalog.weidmueller.com/catalog/Start.do?localeId=en&ObjectID=1633810000
footprint SLD_3_50_90F_04 (OMNIMATE Signal - Serie BL/SL 3.50  SLD 3.50/04/90F 3.2)
part A pins: A1
part B pins: A2
part C pins: B1
part D pins: B2

## 1633820000
designator J?
OMNIMATE Signal - series BL/SL 3.50; PartNumber: 1633820000; Manufacturer: Weidmueller; Short_text_for_material: SLD 3.50/06/90F 3.2SN OR BX; Side_termination_characteristic: Flange; Mounting_onto_the_PCB: Solder connection; Pitch_mm: 3.5 mm; Pitch_inch: 0.138 inch; No_of_poles: 6; Outgoing_elbow: 90°; Solder_pin_length_mm: 3.2 mm; Contact_material: CuSn; Contact_surface: tinned; Insulating_material: PBT; UL_94_flammability_rating: V-0; Rated_voltage_for_surge_voltage_class_pollution_degree_II_2: 200 V; Rated_current_min_no_of_poles_TU_20_deg_C: 32 A; Rated_voltage_use_group_B_UL_1059: 300 V; Rated_current_use_group_B_UL_1059: 8 A; PackageReference: SLD_3_50_90F_06; Colour: Orange; Packaging: Box; Qty: 50 PCS; Revision: V1; ComponentLink1Description: Manufacturer URL; ComponentLink1URL: http://www.weidmueller.com/; ComponentLink2Description: URL Link1; ComponentLink2URL: http://catalog.weidmueller.com/catalog/Start.do?localeId=en&ObjectID=1633820000
footprint SLD_3_50_90F_06 (OMNIMATE Signal - Serie BL/SL 3.50  SLD 3.50/06/90F 3.2)
part A pins: A1, A2, A3
part B pins: B1, B2, B3